# Altium schematic symbol library TTL74系列.SchLib: 649 symbols (part 1 of 6)
Pins are listed as number, name and electrical type; pins without a type are passive.

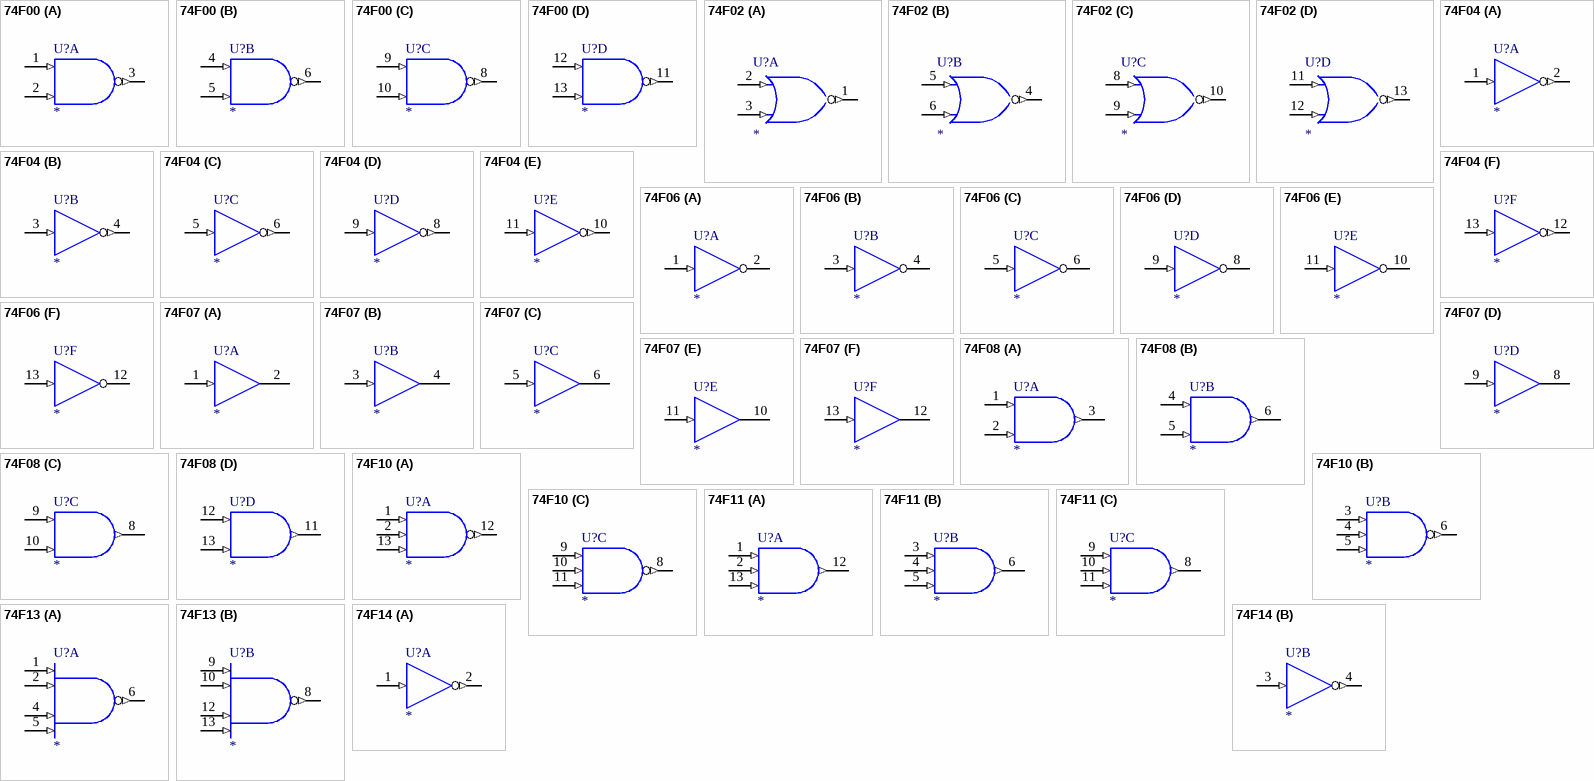
[diagram p0: symbols 74F00 to 74F14]

## 74F00
designator U?
Quad 2-Input Positive-NAND Gate
footprint DIP-14
simulation model 74F00 (SIMCODE)
part A pins: 1 A (in), 2 B (in), 3 Y (out), 7 GND (power) hidden to GND, 14 VCC (power) hidden to VCC
part B pins: 4 A (in), 5 B (in), 6 Y (out), 7 GND (power) hidden to GND, 14 VCC (power) hidden to VCC
part C pins: 7 GND (power) hidden to GND, 8 Y (out), 9 A (in), 10 B (in), 14 VCC (power) hidden to VCC
part D pins: 7 GND (power) hidden to GND, 11 Y (out), 12 A (in), 13 B (in), 14 VCC (power) hidden to VCC
1 alternate drawing of the same symbol

## 74F02
designator U?
Quad 2-Input NOR Gate
footprint DIP-14
simulation model 74F02 (SIMCODE)
part A pins: 1 Y (out), 2 A (in), 3 B (in), 7 GND (power) hidden to GND, 14 VCC (power) hidden to VCC
part B pins: 4 Y (out), 5 A (in), 6 B (in), 7 GND (power) hidden to GND, 14 VCC (power) hidden to VCC
part C pins: 7 GND (power) hidden to GND, 8 A (in), 9 B (in), 10 Y (out), 14 VCC (power) hidden to VCC
part D pins: 7 GND (power) hidden to GND, 11 A (in), 12 B (in), 13 Y (out), 14 VCC (power) hidden to VCC
1 alternate drawing of the same symbol

## 74F04
designator U?
Hex Inverter
footprint DIP-14
simulation model 74F04 (SIMCODE)
part A pins: 1 A (in), 2 Y (out), 7 GND (power) hidden to GND, 14 VCC (power) hidden to VCC
part B pins: 3 A (in), 4 Y (out), 7 GND (power) hidden to GND, 14 VCC (power) hidden to VCC
part C pins: 5 A (in), 6 Y (out), 7 GND (power) hidden to GND, 14 VCC (power) hidden to VCC
part D pins: 7 GND (power) hidden to GND, 8 Y (out), 9 A (in), 14 VCC (power) hidden to VCC
part E pins: 7 GND (power) hidden to GND, 10 Y (out), 11 A (in), 14 VCC (power) hidden to VCC
part F pins: 7 GND (power) hidden to GND, 12 Y (out), 13 A (in), 14 VCC (power) hidden to VCC
1 alternate drawing of the same symbol

## 74F06
designator U?
Hex Inverter with Open-Collector High-Voltage Output
footprint DIP-14
simulation model 74F06 (SIMCODE)
part A pins: 1 A (in), 2 Y (oc), 7 GND (power) hidden to GND, 14 VCC (power) hidden to VCC
part B pins: 3 A (in), 4 Y (oc), 7 GND (power) hidden to GND, 14 VCC (power) hidden to VCC
part C pins: 5 A (in), 6 Y (oc), 7 GND (power) hidden to GND, 14 VCC (power) hidden to VCC
part D pins: 7 GND (power) hidden to GND, 8 Y (oc), 9 A (in), 14 VCC (power) hidden to VCC
part E pins: 7 GND (power) hidden to GND, 10 Y (oc), 11 A (in), 14 VCC (power) hidden to VCC
part F pins: 7 GND (power) hidden to GND, 12 Y (oc), 13 A (in), 14 VCC (power) hidden to VCC
2 alternate drawings of the same symbol

## 74F07
designator U?
Hex Buffer/Driver with Open-Collector High-Voltage Output
footprint DIP-14
simulation model 74F07 (SIMCODE)
part A pins: 1 A (in), 2 Y (oc), 7 GND (power) hidden to GND, 14 VCC (power) hidden to VCC
part B pins: 3 A (in), 4 Y (oc), 7 GND (power) hidden to GND, 14 VCC (power) hidden to VCC
part C pins: 5 A (in), 6 Y (oc), 7 GND (power) hidden to GND, 14 VCC (power) hidden to VCC
part D pins: 7 GND (power) hidden to GND, 8 Y (oc), 9 A (in), 14 VCC (power) hidden to VCC
part E pins: 7 GND (power) hidden to GND, 10 Y (oc), 11 A (in), 14 VCC (power) hidden to VCC
part F pins: 7 GND (power) hidden to GND, 12 Y (oc), 13 A (in), 14 VCC (power) hidden to VCC
2 alternate drawings of the same symbol

## 74F08
designator U?
Quad 2-Input Positive-AND Gate
footprint DIP-14
simulation model 74F08 (SIMCODE)
part A pins: 1 A (in), 2 B (in), 3 Y (out), 7 GND (power) hidden to GND, 14 VCC (power) hidden to VCC
part B pins: 4 A (in), 5 B (in), 6 Y (out), 7 GND (power) hidden to GND, 14 VCC (power) hidden to VCC
part C pins: 7 GND (power) hidden to GND, 8 Y (out), 9 A (in), 10 B (in), 14 VCC (power) hidden to VCC
part D pins: 7 GND (power) hidden to GND, 11 Y (out), 12 A (in), 13 B (in), 14 VCC (power) hidden to VCC
1 alternate drawing of the same symbol

## 74F10
designator U?
Triple 3-Input Positive-NAND Gate
footprint DIP-14
simulation model 74F10 (SIMCODE)
part A pins: 1 A (in), 2 B (in), 7 GND (power) hidden to GND, 12 Y (out), 13 C (in), 14 VCC (power) hidden to VCC
part B pins: 3 A (in), 4 B (in), 5 C (in), 6 Y (out), 7 GND (power) hidden to GND, 14 VCC (power) hidden to VCC
part C pins: 7 GND (power) hidden to GND, 8 Y (out), 9 A (in), 10 B (in), 11 C (in), 14 VCC (power) hidden to VCC
1 alternate drawing of the same symbol

## 74F11
designator U?
Triple 3-Input Positive-AND Gate
footprint DIP-14
simulation model 74F11 (SIMCODE)
part A pins: 1 A (in), 2 B (in), 7 GND (power) hidden to GND, 12 Y (out), 13 C (in), 14 VCC (power) hidden to VCC
part B pins: 3 A (in), 4 B (in), 5 C (in), 6 Y (out), 7 GND (power) hidden to GND, 14 VCC (power) hidden to VCC
part C pins: 7 GND (power) hidden to GND, 8 Y (out), 9 A (in), 10 B (in), 11 C (in), 14 VCC (power) hidden to VCC
1 alternate drawing of the same symbol

## 74F13
designator U?
Dual 4-Input Positive-NAND Schmitt-Trigger
footprint DIP-14
simulation model 74F13 (SIMCODE)
part A pins: 1 A (in), 2 B (in), 4 C (in), 5 D (in), 6 Y (out), 7 GND (power) hidden to GND, 14 VCC (power) hidden to VCC
part B pins: 7 GND (power) hidden to GND, 8 Y (out), 9 A (in), 10 B (in), 12 C (in), 13 D (in), 14 VCC (power) hidden to VCC
1 alternate drawing of the same symbol

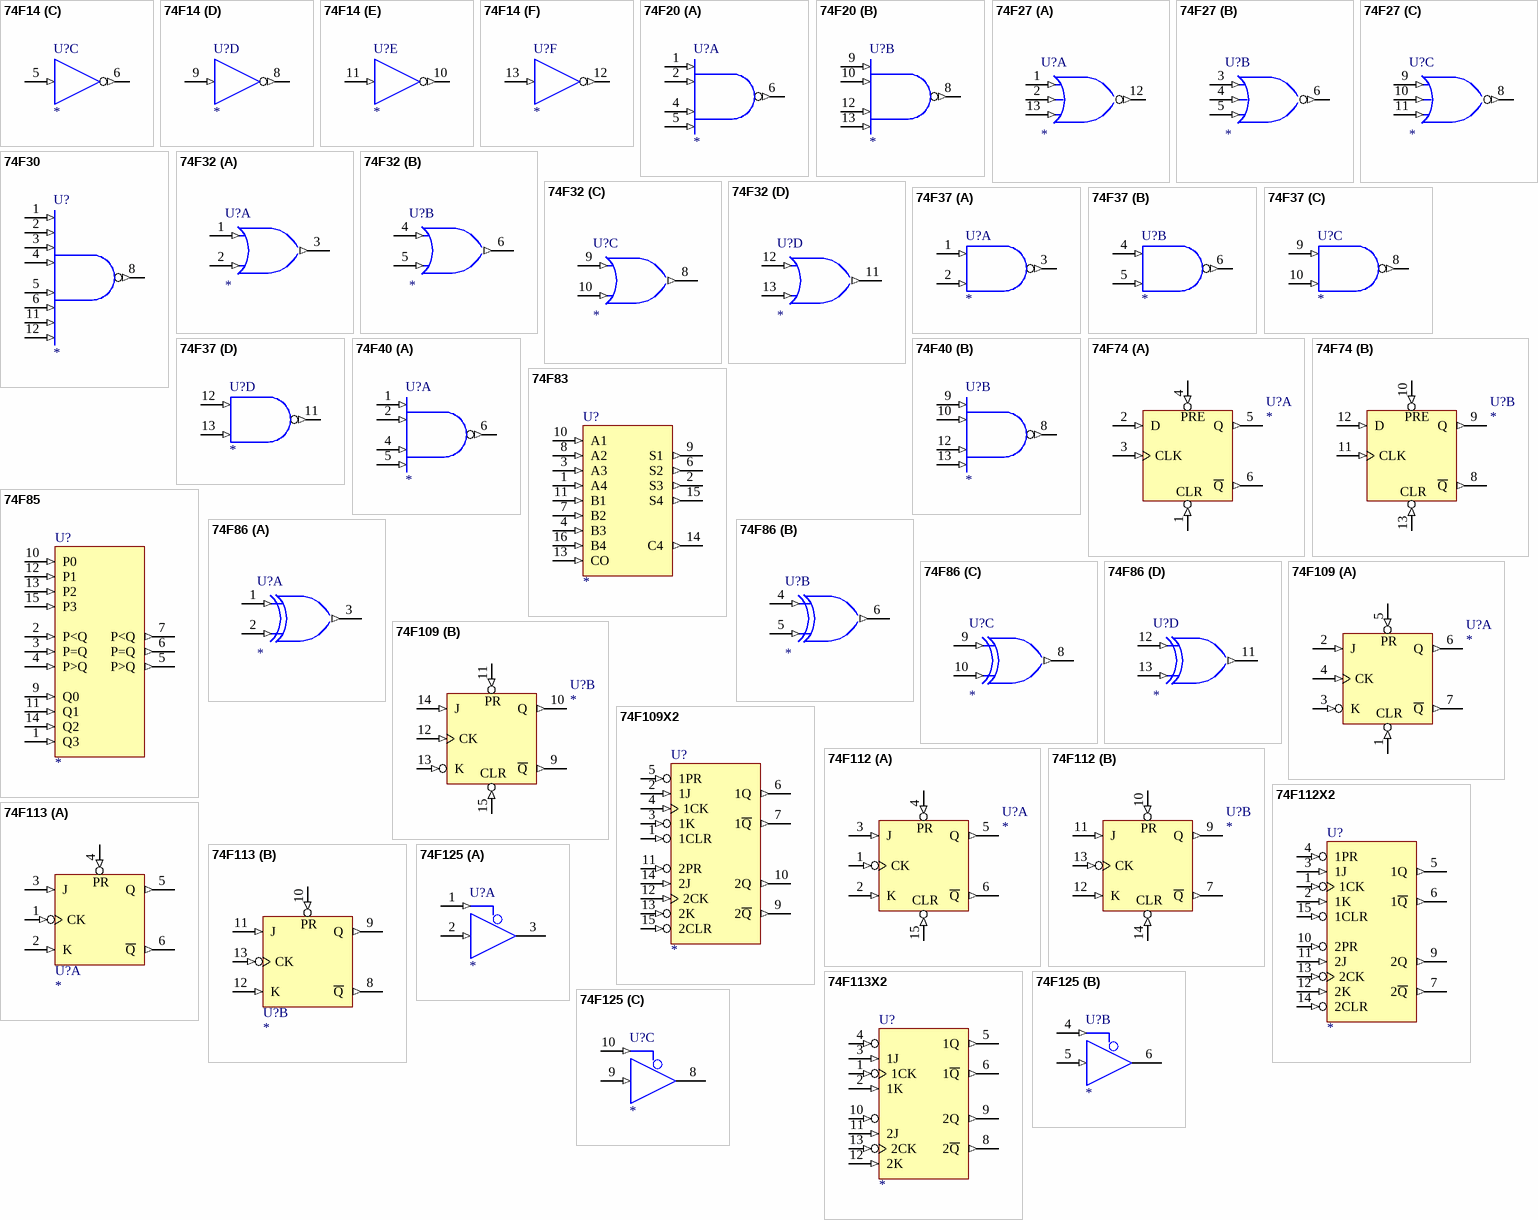
[diagram p1: symbols 74F14 to 74F125]

## 74F14
designator U?
Hex Schmitt-Trigger Inverter
footprint DIP-14
simulation model 74F14 (SIMCODE)
part A pins: 1 A (in), 2 Y (out), 7 GND (power) hidden to GND, 14 VCC (power) hidden to VCC
part B pins: 3 A (in), 4 Y (out), 7 GND (power) hidden to GND, 14 VCC (power) hidden to VCC
part C pins: 5 A (in), 6 Y (out), 7 GND (power) hidden to GND, 14 VCC (power) hidden to VCC
part D pins: 7 GND (power) hidden to GND, 8 Y (out), 9 A (in), 14 VCC (power) hidden to VCC
part E pins: 7 GND (power) hidden to GND, 10 Y (out), 11 A (in), 14 VCC (power) hidden to VCC
part F pins: 7 GND (power) hidden to GND, 12 Y (out), 13 A (in), 14 VCC (power) hidden to VCC
1 alternate drawing of the same symbol

## 74F20
designator U?
Dual 4-Input Positive-NAND Gate
footprint DIP-14
simulation model 74F20 (SIMCODE)
part A pins: 1 A (in), 2 B (in), 4 C (in), 5 D (in), 6 Y (out), 7 GND (power) hidden to GND, 14 VCC (power) hidden to VCC
part B pins: 7 GND (power) hidden to GND, 8 Y (out), 9 A (in), 10 B (in), 12 C (in), 13 D (in), 14 VCC (power) hidden to VCC
2 alternate drawings of the same symbol

## 74F27
designator U?
Triple 3-Input Positive-NOR Gate
footprint DIP-14
simulation model 74F27 (SIMCODE)
part A pins: 1 A (in), 2 B (in), 7 GND (power) hidden to GND, 12 Y (out), 13 C (in), 14 VCC (power) hidden to VCC
part B pins: 3 A (in), 4 B (in), 5 C (in), 6 Y (out), 7 GND (power) hidden to GND, 14 VCC (power) hidden to VCC
part C pins: 7 GND (power) hidden to GND, 8 Y (out), 9 A (in), 10 B (in), 11 C (in), 14 VCC (power) hidden to VCC
1 alternate drawing of the same symbol

## 74F30
designator U?
8-Input Positive-NAND Gate
footprint DIP-14
simulation model 74F30 (SIMCODE)
pins: 1 A (in), 2 B (in), 3 C (in), 4 D (in), 5 E (in), 6 F (in), 7 GND (power) hidden to GND, 8 Y (out), 11 G (in), 12 H (in), 14 VCC (power) hidden to VCC
1 alternate drawing of the same symbol

## 74F32
designator U?
Quad 2-Input Positive-OR Gate
footprint DIP-14
simulation model 74F32 (SIMCODE)
part A pins: 1 A (in), 2 B (in), 3 Y (out), 7 GND (power) hidden to GND, 14 VCC (power) hidden to VCC
part B pins: 4 A (in), 5 B (in), 6 Y (out), 7 GND (power) hidden to GND, 14 VCC (power) hidden to VCC
part C pins: 7 GND (power) hidden to GND, 8 Y (out), 9 A (in), 10 B (in), 14 VCC (power) hidden to VCC
part D pins: 7 GND (power) hidden to GND, 11 Y (out), 12 A (in), 13 B (in), 14 VCC (power) hidden to VCC
1 alternate drawing of the same symbol

## 74F37
designator U?
Quad 2-Input Positive-NAND Buffer
footprint DIP-14
simulation model 74F37 (SIMCODE)
part A pins: 1 A (in), 2 B (in), 3 Y (out), 7 GND (power) hidden to GND, 14 VCC (power) hidden to VCC
part B pins: 4 A (in), 5 B (in), 6 Y (out), 7 GND (power) hidden to GND, 14 VCC (power) hidden to VCC
part C pins: 7 GND (power) hidden to GND, 8 Y (out), 9 A (in), 10 B (in), 14 VCC (power) hidden to VCC
part D pins: 7 GND (power) hidden to GND, 11 Y (out), 12 A (in), 13 B (in), 14 VCC (power) hidden to VCC
1 alternate drawing of the same symbol

## 74F40
designator U?
Dual 4-Input Positive-NAND Buffer
footprint DIP-14
simulation model 74F40 (SIMCODE)
part A pins: 1 A (in), 2 B (in), 4 C (in), 5 D (in), 6 Y (out), 7 GND (power) hidden to GND, 14 VCC (power) hidden to VCC
part B pins: 7 GND (power) hidden to GND, 8 Y (out), 9 A (in), 10 B (in), 12 C (in), 13 D (in), 14 VCC (power) hidden to VCC
2 alternate drawings of the same symbol

## 74F74
designator U?
Dual D-Type Positive-Edge-Triggered Flip-Flop with Clear and Preset
footprint DIP-14
simulation model 74F74 (SIMCODE)
part A pins: 1 ~{CLR} (in), 2 D (in), 3 CLK (in), 4 ~{PRE} (in), 5 Q (out), 6 ~{Q} (out), 7 GND (power) hidden to GND, 14 VCC (power) hidden to VCC
part B pins: 7 GND (power) hidden to GND, 8 ~{Q} (out), 9 Q (out), 10 ~{PRE} (in), 11 CLK (in), 12 D (in), 13 ~{CLR} (in), 14 VCC (power) hidden to VCC
1 alternate drawing of the same symbol
part A text: PRE; CLR
part B text: PRE; CLR

## 74F83
designator U?
4-Bit Binary Full Adder with Fast Carry
footprint DIP-16
simulation model 74F83 (SIMCODE)
pins: 1 A4 (in), 2 S3 (out), 3 A3 (in), 4 B3 (in), 5 VCC (power) hidden to VCC, 6 S2 (out), 7 B2 (in), 8 A2 (in), 9 S1 (out), 10 A1 (in), 11 B1 (in), 12 GND (power) hidden to GND, 13 CO (in), 14 C4 (out), 15 S4 (out), 16 B4 (in)
1 alternate drawing of the same symbol

## 74F85
designator U?
4-Bit Magnitude Comparator
footprint DIP-16
simulation model 74F85 (SIMCODE)
pins: 1 Q3 (in), 2 P<Q (in), 3 P=Q (in), 4 P>Q (in), 5 P>Q (out), 6 P=Q (out), 7 P<Q (out), 8 GND (power) hidden to GND, 9 Q0 (in), 10 P0 (in), 11 Q1 (in), 12 P1 (in), 13 P2 (in), 14 Q2 (in), 15 P3 (in), 16 VCC (power) hidden to VCC
1 alternate drawing of the same symbol

## 74F86
designator U?
Quad Exclusive-OR Gate
footprint DIP-14
simulation model 74F86 (SIMCODE)
part A pins: 1 A (in), 2 B (in), 3 Y (out), 7 GND (power) hidden to GND, 14 VCC (power) hidden to VCC
part B pins: 4 A (in), 5 B (in), 6 Y (out), 7 GND (power) hidden to GND, 14 VCC (power) hidden to VCC
part C pins: 7 GND (power) hidden to GND, 8 Y (out), 9 A (in), 10 B (in), 14 VCC (power) hidden to VCC
part D pins: 7 GND (power) hidden to GND, 11 Y (out), 12 A (in), 13 B (in), 14 VCC (power) hidden to VCC
1 alternate drawing of the same symbol

## 74F109
designator U?
Dual J-~K Positive-Edge-Triggered Flip Flop with Preset and Clear
footprint DIP-16
simulation model 74F109 (SIMCODE)
part A pins: 1 CLR (in), 2 J (in), 3 K (in), 4 CK (in), 5 PR (in), 6 Q (out), 7 ~{Q} (out), 8 GND (power) hidden to GND, 16 VCC (power) hidden to VCC
part B pins: 8 GND (power) hidden to GND, 9 ~{Q} (out), 10 Q (out), 11 PR (in), 12 CK (in), 13 K (in), 14 J (in), 15 CLR (in), 16 VCC (power) hidden to VCC
1 alternate drawing of the same symbol

## 74F109X2
designator U?
Dual J-~K Positive-Edge-Triggered Flip Flop with Preset and Clear
footprint DIP-16
simulation model 74F109X2 (SIMCODE)
pins: 1 1CLR (in), 2 1J (in), 3 1K (in), 4 1CK (in), 5 1PR (in), 6 1Q (out), 7 1~{Q} (out), 8 GND (power) hidden to GND, 9 2~{Q} (out), 10 2Q (out), 11 2PR (in), 12 2CK (in), 13 2K (in), 14 2J (in), 15 2CLR (in), 16 VCC (power) hidden to VCC
1 alternate drawing of the same symbol

## 74F112
designator U?
Dual J-K Negative-Edge-Triggered Flip-Flop with Clear and Preset
footprint DIP-16
simulation model 74F112 (SIMCODE)
part A pins: 1 CK (in), 2 K (in), 3 J (in), 4 PR (in), 5 Q (out), 6 ~{Q} (out), 8 GND (power) hidden to GND, 15 CLR (in), 16 VCC (power) hidden to VCC
part B pins: 7 ~{Q} (out), 8 GND (power) hidden to GND, 9 Q (out), 10 PR (in), 11 J (in), 12 K (in), 13 CK (in), 14 CLR (in), 16 VCC (power) hidden to VCC
1 alternate drawing of the same symbol

## 74F112X2
designator U?
Dual J-K Negative-Edge-Triggered Flip-Flop with Clear and Preset
footprint DIP-16
simulation model 74F112X2 (SIMCODE)
pins: 1 1CK (in), 2 1K (in), 3 1J (in), 4 1PR (in), 5 1Q (out), 6 1~{Q} (out), 7 2~{Q} (out), 8 GND (power) hidden to GND, 9 2Q (out), 10 2PR (in), 11 2J (in), 12 2K (in), 13 2CK (in), 14 2CLR (in), 15 1CLR (in), 16 VCC (power) hidden to VCC
1 alternate drawing of the same symbol

## 74F113
designator U?
Dual J-K Negative-Edge-Triggered Flip-Flop with Preset
footprint DIP-14
simulation model 74F113 (SIMCODE)
part A pins: 1 CK (in), 2 K (in), 3 J (in), 4 PR (in), 5 Q (out), 6 ~{Q} (out), 7 GND (power) hidden to GND, 14 VCC (power) hidden to VCC
part B pins: 7 GND (power) hidden to GND, 8 ~{Q} (out), 9 Q (out), 10 PR (in), 11 J (in), 12 K (in), 13 CK (in), 14 VCC (power) hidden to VCC
1 alternate drawing of the same symbol

## 74F113X2
designator U?
Dual J-K Negative-Edge-Triggered Flip-Flop with Preset
footprint DIP-14
simulation model 74F113X2 (SIMCODE)
pins: 1 1CK (in), 2 1K (in), 3 1J (in), 4 1PR (in), 5 1Q (out), 6 1~{Q} (out), 7 GND (power) hidden to GND, 8 2~{Q} (out), 9 2Q (out), 10 2PR (in), 11 2J (in), 12 2K (in), 13 2CK (in), 14 VCC (power) hidden to VCC
1 alternate drawing of the same symbol

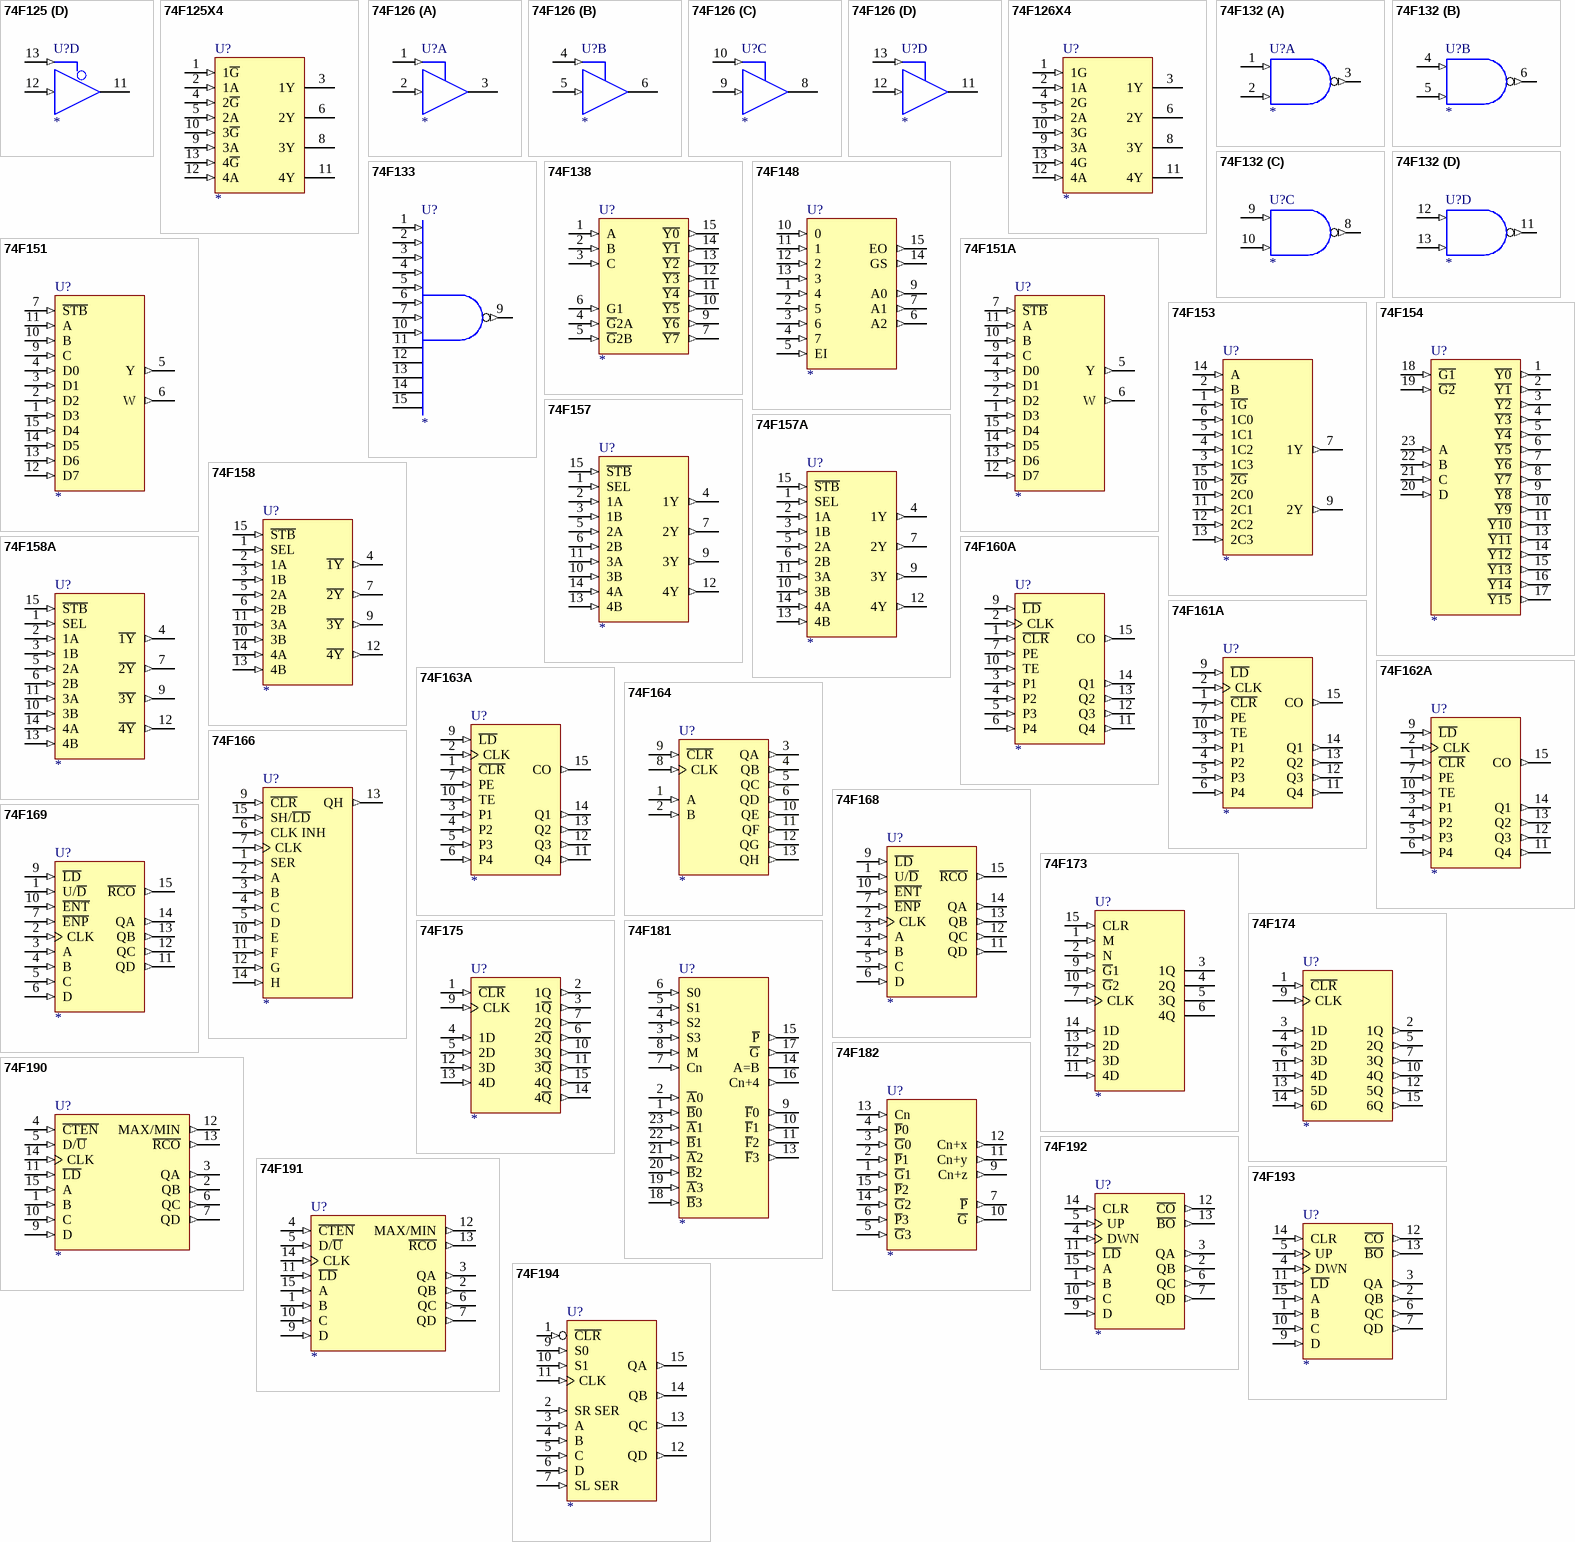
[diagram p2: symbols 74F125 to 74F194]

## 74F125
designator U?
Quad Bus Buffer Gate with 3-State Output
footprint DIP-14
simulation model 74F125 (SIMCODE)
part A pins: 1 ~{G} (in), 2 A (in), 3 Y (hiz), 7 GND (power) hidden to GND, 14 VCC (power) hidden to VCC
part B pins: 4 ~{G} (in), 5 A (in), 6 Y (hiz), 7 GND (power) hidden to GND, 14 VCC (power) hidden to VCC
part C pins: 7 GND (power) hidden to GND, 8 Y (hiz), 9 A (in), 10 ~{G} (in), 14 VCC (power) hidden to VCC
part D pins: 7 GND (power) hidden to GND, 11 Y (hiz), 12 A (in), 13 ~{G} (in), 14 VCC (power) hidden to VCC
1 alternate drawing of the same symbol

## 74F125X4
designator U?
Quad Bus Buffer Gate with 3-State Output
footprint DIP-14
simulation model 74F125X4 (SIMCODE)
pins: 1 1~{G} (in), 2 1A (in), 3 1Y (hiz), 4 2~{G} (in), 5 2A (in), 6 2Y (hiz), 7 GND (power) hidden to GND, 8 3Y (hiz), 9 3A (in), 10 3~{G} (in), 11 4Y (hiz), 12 4A (in), 13 4~{G} (in), 14 VCC (power) hidden to VCC
1 alternate drawing of the same symbol

## 74F126
designator U?
Quad Bus Buffer Gate with 3-State Output
footprint DIP-14
simulation model 74F126 (SIMCODE)
part A pins: 1 G (in), 2 A (in), 3 Y (hiz), 7 GND (power) hidden to GND, 14 VCC (power) hidden to VCC
part B pins: 4 G (in), 5 A (in), 6 Y (hiz), 7 GND (power) hidden to GND, 14 VCC (power) hidden to VCC
part C pins: 7 GND (power) hidden to GND, 8 Y (hiz), 9 A (in), 10 G (in), 14 VCC (power) hidden to VCC
part D pins: 7 GND (power) hidden to GND, 11 Y (hiz), 12 A (in), 13 G (in), 14 VCC (power) hidden to VCC
1 alternate drawing of the same symbol

## 74F126X4
designator U?
Quad Bus Buffer Gate with 3-State Output
footprint DIP-14
simulation model 74F126X4 (SIMCODE)
pins: 1 1G (in), 2 1A (in), 3 1Y (hiz), 4 2G (in), 5 2A (in), 6 2Y (hiz), 7 GND (power) hidden to GND, 8 3Y (hiz), 9 3A (in), 10 3G (in), 11 4Y (hiz), 12 4A (in), 13 4G (in), 14 VCC (power) hidden to VCC
1 alternate drawing of the same symbol

## 74F132
designator U?
Quad Positive-NAND Gate with Schmitt-Trigger Input
footprint DIP-14
simulation model 74F132 (SIMCODE)
part A pins: 1 A (in), 2 B (in), 3 Y (out), 7 GND (power) hidden to GND, 14 VCC (power) hidden to VCC
part B pins: 4 A (in), 5 B (in), 6 Y (out), 7 GND (power) hidden to GND, 14 VCC (power) hidden to VCC
part C pins: 7 GND (power) hidden to GND, 8 Y (out), 9 A (in), 10 B (in), 14 VCC (power) hidden to VCC
part D pins: 7 GND (power) hidden to GND, 11 Y (out), 12 A (in), 13 B (in), 14 VCC (power) hidden to VCC
1 alternate drawing of the same symbol

## 74F133
designator U?
13-Input Positive-NAND Gate
footprint DIP-16
simulation model 74F133 (SIMCODE)
pins: 1 A (in), 2 B (in), 3 C (in), 4 D (in), 5 E (in), 6 F (in), 7 G (in), 8 GND (power) hidden to GND, 9 Y (out), 10 H (in), 11 I, 12 J, 13 K, 14 L, 15 M, 16 VCC (power) hidden to VCC
2 alternate drawings of the same symbol

## 74F138
designator U?
3-Line to 8-Line Decoder/Demultiplexer
footprint DIP-16
simulation model 74F138 (SIMCODE)
pins: 1 A (in), 2 B (in), 3 C (in), 4 ~{G}2A (in), 5 ~{G}2B (in), 6 G1 (in), 7 ~{Y7} (out), 8 GND (power) hidden to GND, 9 ~{Y6} (out), 10 ~{Y5} (out), 11 ~{Y4} (out), 12 ~{Y3} (out), 13 ~{Y2} (out), 14 ~{Y1} (out), 15 ~{Y0} (out), 16 VCC (power) hidden to VCC
1 alternate drawing of the same symbol

## 74F148
designator U?
8-Line to 3-Line Priority Encoder
footprint DIP-16
simulation model 74F148 (SIMCODE)
pins: 1 4 (in), 2 5 (in), 3 6 (in), 4 7 (in), 5 EI (in), 6 A2 (out), 7 A1 (out), 8 GND (power) hidden to GND, 9 A0 (out), 10 0 (in), 11 1 (in), 12 2 (in), 13 3 (in), 14 GS (out), 15 EO (out), 16 VCC (power) hidden to VCC
1 alternate drawing of the same symbol

## 74F151
designator U?
1 of 8 Data Selector/Multiplexer
footprint DIP-16
simulation model 74F151 (SIMCODE)
pins: 1 D3 (in), 2 D2 (in), 3 D1 (in), 4 D0 (in), 5 Y (out), 6 W (out), 7 ~{STB} (in), 8 GND (power) hidden to GND, 9 C (in), 10 B (in), 11 A (in), 12 D7 (in), 13 D6 (in), 14 D5 (in), 15 D4 (in), 16 VCC (power) hidden to VCC
1 alternate drawing of the same symbol

## 74F151A
designator U?
1 of 8 Data Selector/Multiplexer
footprint DIP-16
simulation model 74F151A (SIMCODE)
pins: 1 D3 (in), 2 D2 (in), 3 D1 (in), 4 D0 (in), 5 Y (out), 6 W (out), 7 ~{STB} (in), 8 GND (power) hidden to GND, 9 C (in), 10 B (in), 11 A (in), 12 D7 (in), 13 D6 (in), 14 D5 (in), 15 D4 (in), 16 VCC (power) hidden to VCC
1 alternate drawing of the same symbol

## 74F153
designator U?
Dual 4-Line to 1-Line Data Selector/Multiplexer
footprint DIP-16
simulation model 74F153 (SIMCODE)
pins: 1 ~{1G} (in), 2 B (in), 3 1C3 (in), 4 1C2 (in), 5 1C1 (in), 6 1C0 (in), 7 1Y (out), 8 GND (power) hidden to GND, 9 2Y (out), 10 2C0 (in), 11 2C1 (in), 12 2C2 (in), 13 2C3 (in), 14 A (in), 15 ~{2G} (in), 16 VCC (power) hidden to VCC
1 alternate drawing of the same symbol

## 74F154
designator U?
4-Line to 16-Line Decoder/Demultiplexer
footprint DIP-24
simulation model 74F154 (SIMCODE)
pins: 1 ~{Y0} (out), 2 ~{Y1} (out), 3 ~{Y2} (out), 4 ~{Y3} (out), 5 ~{Y4} (out), 6 ~{Y5} (out), 7 ~{Y6} (out), 8 ~{Y7} (out), 9 ~{Y8} (out), 10 ~{Y9} (out), 11 ~{Y10} (out), 12 GND (power) hidden to GND, 13 ~{Y11} (out), 14 ~{Y12} (out), 15 ~{Y13} (out), 16 ~{Y14} (out), 17 ~{Y15} (out), 18 ~{G1} (in), 19 ~{G2} (in), 20 D (in), 21 C (in), 22 B (in), 23 A (in), 24 VCC (power) hidden to VCC
1 alternate drawing of the same symbol

## 74F157
designator U?
Quad 2-Line to 1-Line Data Selector/Multiplexer
footprint DIP-16
simulation model 74F157 (SIMCODE)
pins: 1 SEL (in), 2 1A (in), 3 1B (in), 4 1Y (out), 5 2A (in), 6 2B (in), 7 2Y (out), 8 GND (power) hidden to GND, 9 3Y (out), 10 3B (in), 11 3A (in), 12 4Y (out), 13 4B (in), 14 4A (in), 15 ~{STB} (in), 16 VCC (power) hidden to VCC
1 alternate drawing of the same symbol

## 74F157A
designator U?
Quad 2-Line to 1-Line Data Selector/Multiplexer
footprint DIP-16
simulation model 74F157A (SIMCODE)
pins: 1 SEL (in), 2 1A (in), 3 1B (in), 4 1Y (out), 5 2A (in), 6 2B (in), 7 2Y (out), 8 GND (power) hidden to GND, 9 3Y (out), 10 3B (in), 11 3A (in), 12 4Y (out), 13 4B (in), 14 4A (in), 15 ~{STB} (in), 16 VCC (power) hidden to VCC
1 alternate drawing of the same symbol

## 74F158
designator U?
Quad 2-Line to 1-Line Data Selector/Multiplexer
footprint DIP-16
simulation model 74F158 (SIMCODE)
pins: 1 SEL (in), 2 1A (in), 3 1B (in), 4 ~{1Y} (out), 5 2A (in), 6 2B (in), 7 ~{2Y} (out), 8 GND (power) hidden to GND, 9 ~{3Y} (out), 10 3B (in), 11 3A (in), 12 ~{4Y} (out), 13 4B (in), 14 4A (in), 15 ~{STB} (in), 16 VCC (power) hidden to VCC
1 alternate drawing of the same symbol

## 74F158A
designator U?
Quad 2-Line to 1-Line Data Selector/Multiplexer
footprint DIP-16
simulation model 74F158A (SIMCODE)
pins: 1 SEL (in), 2 1A (in), 3 1B (in), 4 ~{1Y} (out), 5 2A (in), 6 2B (in), 7 ~{2Y} (out), 8 GND (power) hidden to GND, 9 ~{3Y} (out), 10 3B (in), 11 3A (in), 12 ~{4Y} (out), 13 4B (in), 14 4A (in), 15 ~{STB} (in), 16 VCC (power) hidden to VCC
1 alternate drawing of the same symbol

## 74F160A
designator U?
Synchronous 4-Bit Decade Counter with Direct Clear
footprint DIP-16
simulation model 74F160A (SIMCODE)
pins: 1 ~{CLR} (in), 2 CLK (in), 3 P1 (in), 4 P2 (in), 5 P3 (in), 6 P4 (in), 7 PE (in), 8 GND (power) hidden to GND, 9 ~{LD} (in), 10 TE (in), 11 Q4 (out), 12 Q3 (out), 13 Q2 (out), 14 Q1 (out), 15 CO (out), 16 VCC (power) hidden to VCC
1 alternate drawing of the same symbol

## 74F161A
designator U?
Synchronous 4-Bit Binary Counter with Direct Clear
footprint DIP-16
simulation model 74F161A (SIMCODE)
pins: 1 ~{CLR} (in), 2 CLK (in), 3 P1 (in), 4 P2 (in), 5 P3 (in), 6 P4 (in), 7 PE (in), 8 GND (power) hidden to GND, 9 ~{LD} (in), 10 TE (in), 11 Q4 (out), 12 Q3 (out), 13 Q2 (out), 14 Q1 (out), 15 CO (out), 16 VCC (power) hidden to VCC
1 alternate drawing of the same symbol

## 74F162A
designator U?
Fully Synchronous 4-Bit Decade Counter
footprint DIP-16
simulation model 74F162A (SIMCODE)
pins: 1 ~{CLR} (in), 2 CLK (in), 3 P1 (in), 4 P2 (in), 5 P3 (in), 6 P4 (in), 7 PE (in), 8 GND (power) hidden to GND, 9 ~{LD} (in), 10 TE (in), 11 Q4 (out), 12 Q3 (out), 13 Q2 (out), 14 Q1 (out), 15 CO (out), 16 VCC (power) hidden to VCC
1 alternate drawing of the same symbol

## 74F163A
designator U?
Fully Synchronous 4-Bit Binary Counter
footprint DIP-16
simulation model 74F163A (SIMCODE)
pins: 1 ~{CLR} (in), 2 CLK (in), 3 P1 (in), 4 P2 (in), 5 P3 (in), 6 P4 (in), 7 PE (in), 8 GND (power) hidden to GND, 9 ~{LD} (in), 10 TE (in), 11 Q4 (out), 12 Q3 (out), 13 Q2 (out), 14 Q1 (out), 15 CO (out), 16 VCC (power) hidden to VCC
1 alternate drawing of the same symbol

## 74F164
designator U?
8-Bit Parallel-Out Serial Shift Register
footprint DIP-14
simulation model 74F164 (SIMCODE)
pins: 1 A (in), 2 B (in), 3 QA (out), 4 QB (out), 5 QC (out), 6 QD (out), 7 GND (power) hidden to GND, 8 CLK (in), 9 ~{CLR} (in), 10 QE (out), 11 QF (out), 12 QG (out), 13 QH (out), 14 VCC (power) hidden to VCC
1 alternate drawing of the same symbol

## 74F166
designator U?
Parallel-Load 8-Bit Shift Register
footprint DIP-16
simulation model 74F166 (SIMCODE)
pins: 1 SER (in), 2 A (in), 3 B (in), 4 C (in), 5 D (in), 6 CLK INH (in), 7 CLK (in), 8 GND (power) hidden to GND, 9 ~{CLR} (in), 10 E (in), 11 F (in), 12 G (in), 13 QH (out), 14 H (in), 15 SH/~{LD} (in), 16 VCC (power) hidden to VCC
1 alternate drawing of the same symbol

## 74F168
designator U?
Synchronous 4-Bit Up/Down Decade Counter
footprint DIP-16
simulation model 74F168 (SIMCODE)
pins: 1 U/~{D} (in), 2 CLK (in), 3 A (in), 4 B (in), 5 C (in), 6 D (in), 7 ~{ENP} (in), 8 GND (power) hidden to GND, 9 ~{LD} (in), 10 ~{ENT} (in), 11 QD (out), 12 QC (out), 13 QB (out), 14 QA (out), 15 ~{RCO} (out), 16 VCC (power) hidden to VCC
1 alternate drawing of the same symbol

## 74F169
designator U?
Synchronous 4-Bit Up/Down Decade Counter
footprint DIP-16
simulation model 74F169 (SIMCODE)
pins: 1 U/~{D} (in), 2 CLK (in), 3 A (in), 4 B (in), 5 C (in), 6 D (in), 7 ~{ENP} (in), 8 GND (power) hidden to GND, 9 ~{LD} (in), 10 ~{ENT} (in), 11 QD (out), 12 QC (out), 13 QB (out), 14 QA (out), 15 ~{RCO} (out), 16 VCC (power) hidden to VCC
1 alternate drawing of the same symbol

## 74F173
designator U?
4-Bit D-Type Register with 3-State Outputs
footprint DIP-16
simulation model 74F173 (SIMCODE)
pins: 1 M (in), 2 N (in), 3 1Q (hiz), 4 2Q (hiz), 5 3Q (hiz), 6 4Q (hiz), 7 CLK (in), 8 GND (power) hidden to GND, 9 ~{G}1 (in), 10 ~{G}2 (in), 11 4D (in), 12 3D (in), 13 2D (in), 14 1D (in), 15 CLR (in), 16 VCC (power) hidden to VCC
1 alternate drawing of the same symbol
